# Altium footprint library MH_DA_THU_VIEN_16122016.PcbLib: 531 footprints (part 34 of 34)
Each footprint in its own frame and in the unit in brackets; x right, y up, seen from the top. Pads: shape width x height; smd on the part's side, far side on the other; paste and mask are expansions set on the pad; w line width, h text height; cw(c..) or ccw(c..) is an arc to the next point about the centre after c.
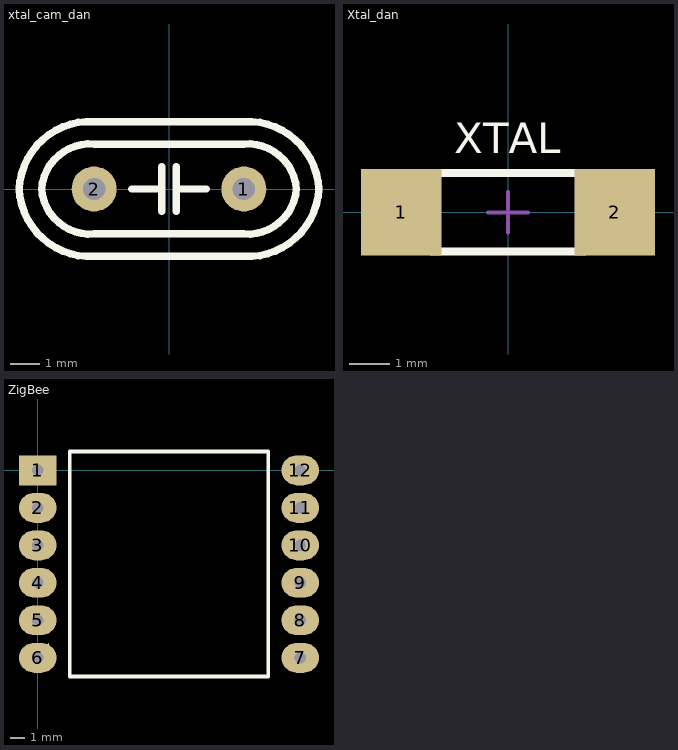
[diagram p33: the footprints below, top view; thin cyan lines are the x and y axes]

## xtal_cam_dan [mil]
pads (2):
  round 60 hole 30: 1(100,0) 2(-100,0)
Top Overlay:
  lines w10: -50,0 -40,0 -10,0 ; -10,-30 -10,30 ; 10,-30 10,30 ; 10,0 50,0 20,0 ; -200,0 cw(c-105,-5) -100,90 100,90 cw(c105,-5) 200,0 cw(c105,5) 100,-90 -100,-90 cw(c-105,5) -200,0 ; -170,0 cw(c-105,-5) -100,60 100,60 cw(c105,-5) 170,0 cw(c105,5) 100,-60 -100,-60 cw(c-105,5) -170,0

## Xtal_dan [mm] "Thach Anh Dan 5.08mm"
height 3
pads (2):
  rect 2x2.15 smd: 1(-2.65,0) 2(2.65,0)
Top Overlay:
  lines w0.2: -1.9,-0.975 1.9,-0.975 ; -1.9,0.975 1.9,0.975
  text "XTAL" at -1.333,1.473 h0.76
Mechanical 13:
  lines w0.1: -2.54,-1 -2.54,1 2.54,1 2.54,-1 -2.54,-1
Mechanical 15:
  lines w0.1: -0.5,0 0.5,0 ; 0,-0.5 0,0.5
3D body: height 3, standoff 0, extent -2.54,-1 2.54,1

## ZigBee [mil]
pads (12):
  rect 100x80 hole 30: 1(0,0)
  oval 100x80 hole 30: 2(0,-100) 3(0,-200) 4(0,-300) 5(0,-400) 6(0,-500) 7(700,-500) 8(700,-400) 9(700,-300) 10(700,-200) 11(700,-100) 12(700,0)
Top Overlay:
  region: 3.92,-486.8 28.92,-511.8 28.92,-461.8
  lines w10: 85,-550 85,50 375,50 615,50 615,-550 85,-550
3D body: height 220.47, standoff -220.47, extent -45.27,-540.94 53.15,55.13
3D body: height 220.47, standoff -220.47, extent 649.21,-544.09 747.64,51.97
3D body: height 169.36, standoff 101.36, extent 0.79,-555.11 700.79,544.89